# Altium footprint library DrPCB.PcbLib: 910 footprints (part 10 of 57)
Each footprint in its own frame and in the unit in brackets; x right, y up, seen from the top. Pads: shape width x height; smd on the part's side, far side on the other; paste and mask are expansions set on the pad; w line width, h text height; cw(c..) or ccw(c..) is an arc to the next point about the centre after c.
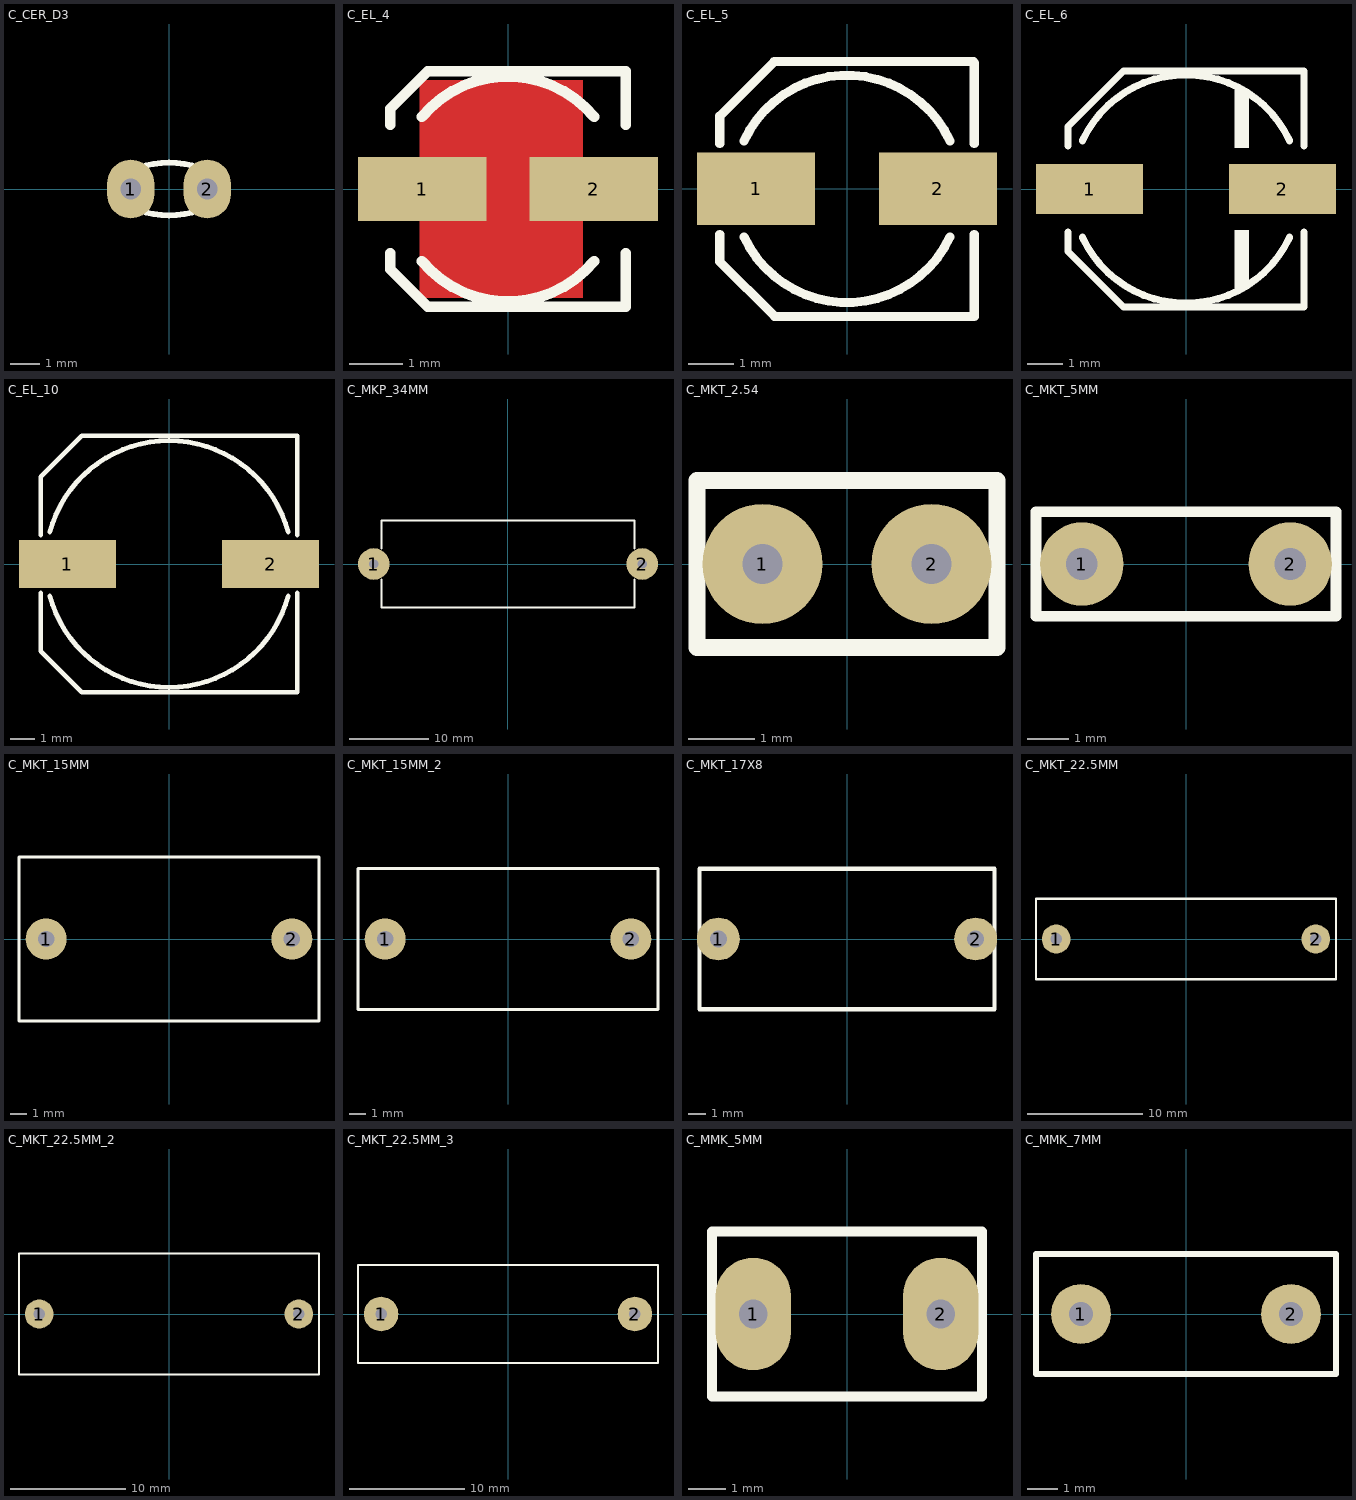
[diagram p9: the footprints below, top view; thin cyan lines are the x and y axes]

## C_CER_D3 [mm] "CAP, CER MULTILAYER, D:3.5mm, pitch: 2.54mm"
height 5.5
pads (2):
  oval 1.6x2 hole 0.7: 1(-1.3,0) 2(1.3,0)
Top Overlay:
  lines w0.2: -0.776,-0.798 ccw(c0,2.1) 0.776,-0.798 ; -0.776,0.798 cw(c0,-2.1) 0.776,0.798
3D body "User Library-Cer-Cap2 (3_5x1_5).step": height 4, standoff -2.5, extent -1.75,-0.75 1.75,0.751

## C_EL_4 [mm] "Electrolytic Cap, D: 4.3mm, Size B, 3.9mm Height"
height 3.9
pads (2):
  rect 2.4x1.2 smd: 1(-1.6,0) 2(1.6,0)
Top Layer:
  pour cut-out: 1.397,2.032 1.397,-2.032 -1.651,-2.032 -1.651,2.032
Top Overlay:
  lines w0.2: -2.2,-1.2 -2.2,-1.5 -1.5,-2.2 2.2,-2.2 2.2,-1.2 ; -2.2,1.2 -2.2,1.5 -1.5,2.2 2.2,2.2 2.2,1.2 ; -1.609,-1.35 ccw(c0,0) 1.609,-1.35 ; -1.609,1.35 cw(c0,0) 1.609,1.35
3D body "User Library-CAPSMD4x3_9.STEP": height 3.91, standoff 0, extent -2.257,-2.15 2.343,2.15

## C_EL_5 [mm] "Electrolytic Cap, D: 5.0mm, L: 5.8mm, Size C"
pads (2):
  rect 2.6x1.6 smd: 1(-2,0) 2(2,0)
Top Overlay:
  lines w0.2: -2.8,-1 -2.8,-1.6 -1.593,-2.807 2.8,-2.807 2.8,-1 ; -2.8,1 -2.8,1.6 -1.6,2.8 2.781,2.8 ; -2.266,-1.057 ccw(c0,0) 2.266,-1.057 ; -2.266,1.057 cw(c0,0) 2.266,1.057 ; 2.8,1 2.8,2.769
3D body "User Library-ALU-C.STEP": height 5.41, standoff 0, extent -2.95,-2.65 2.95,2.65

## C_EL_6 [mm] "Electrolytic Cap, D: 6.3mm L: 3.9mm, Size D"
height 4
pads (2):
  rect 3x1.4 smd: 1(-2.7,0) 2(2.7,0)
Top Overlay:
  rectangle: 1.36,-2.8 1.76,-1.143
  rectangle: 1.36,1.143 1.76,2.8
  lines w0.2: -3.3,-1.2 -3.3,-1.75 -1.75,-3.3 3.3,-3.3 3.3,-1.2 ; -3.3,1.2 -3.3,1.75 -1.75,3.3 3.3,3.3 3.3,1.2 ; -2.9,-1.352 ccw(c0,0) 2.9,-1.352 ; -2.9,1.352 cw(c0,0) 2.9,1.352
3D body "User Library-ALU-D.STEP": height 5.4, standoff 0, extent -3.5,-3.3 3.5,3.3

## C_EL_10 [mm] "Electrolytic Cap, 10.3mm, L: 10mm"
height 10
pads (2):
  rect 4x2 smd: 1(-4.2,0) 2(4.2,0)
Top Overlay:
  lines w0.2: -5.3,-1.2 -5.3,-3.6 -3.6,-5.3 5.3,-5.3 5.3,-1.2 ; -5.3,1.2 -5.3,3.6 -3.6,5.3 5.3,5.3 5.3,1.2 ; -4.926,-1.32 ccw(c0,0) 4.926,-1.32 ; -4.926,1.32 cw(c0,0) 4.926,1.32
3D body "User Library-ALU-G.STEP": height 10.2, standoff 0, extent -5.8,-5.15 5.8,5.15

## C_MKP_34MM [mm]
pads (2):
  round 4 hole 1.2: 1(-17,0) 2(17,0)
Top Overlay:
  lines w0.254: -16,-1.943 -16,-5.5 16,-5.5 16,-1.943 ; -16,1.943 -16,5.5 16,5.5 16,1.943

## C_MKT_2.54 [mm]
pads (2):
  round 1.8 hole 0.6: 1(-1.27,0) 2(1.27,0)
Top Overlay:
  lines w0.254: -2.25,1.206 -2.25,-1.25 2.25,-1.25 2.25,1.206 ; -2.25,1.25 2.25,1.25

## C_MKT_5MM [mm]
pads (2):
  round 2 hole 0.762: 1(-2.5,0) 2(2.5,0)
Top Overlay:
  lines w0.254: -3.6,-1.25 -3.6,1.25 3.6,1.25 3.6,-1.25 -3.6,-1.25
3D body "47nF Film Capacitor MKT.STEP": height 6.41, standoff -15.14, extent -3.55,-1.15 3.55,1.15

## C_MKT_15MM [mm]
pads (2):
  round 2.5 hole 1: 1(-7.5,0) 2(7.5,0)
Top Overlay:
  lines w0.2: -9.157,-5.004 -9.157,5.004 9.157,5.004 9.157,-5.004 -9.157,-5.004
3D body "r463i333050m1k.stp": height 16.11, standoff -4.99, extent -9.25,-5.101 9.25,5.101

## C_MKT_15MM_2 [mm]
pads (2):
  round 2.5 hole 1: 1(-7.5,0) 2(7.5,0)
Top Overlay:
  lines w0.2: -9.157,-4.3 -9.157,4.3 9.157,4.3 9.157,-4.3 -9.157,-4.3
3D body: height 14.8, standoff 0, extent -9.169,-4.305 9.131,4.267

## C_MKT_17X8 [mm]
pads (2):
  round 2.5 hole 1: 1(-7.5,0) 2(7.5,0)
Top Overlay:
  lines w0.254: -8.6,-4.1 -8.6,4.1 8.6,4.1 8.6,-4.1 -8.6,-4.1

## C_MKT_22.5MM [mm]
pads (2):
  round 2.5 hole 1: 1(-11.25,0) 2(11.25,0)
Top Overlay:
  lines w0.2: -13,-3.5 -13,3.5 13,3.5 13,-3.5 -13,-3.5
3D body "phe426hd7100jr06l2.stp": height 16.5, standoff -6, extent -13,-3.503 13,3.503

## C_MKT_22.5MM_2 [mm]
pads (2):
  round 2.5 hole 1: 1(-11.25,0) 2(11.25,0)
Top Overlay:
  lines w0.2: -13,-5.25 13,-5.25 13,5.25 -13,5.25 -13,-5.25
3D body: height 19, standoff 0, extent -12.992,-5.245 13.005,5.232

## C_MKT_22.5MM_3 [mm]
pads (2):
  round 3 hole 1: 1(-11,0) 2(11,0)
Top Overlay:
  lines w0.2: -13,-4.25 13,-4.25 13,4.25 -13,4.25 -13,-4.25
3D body: height 17, standoff 0, extent -13.018,-4.267 12.992,4.242

## C_MMK_5MM [mm]
pads (2):
  oval 2x3 hole 0.762: 1(-2.5,0) 2(2.5,0)
Top Overlay:
  lines w0.254: -3.6,-2.2 -3.6,2.2 3.6,2.2 3.6,-2.2 -3.6,-2.2

## C_MMK_7MM [mm]
pads (2):
  round 2 hole 0.8: 1(-3.5,0) 2(3.5,0)
Top Overlay:
  lines w0.2: -5,-2 5,-2 ; -5,-1.972 -5,2 5,2 5,-1.972
3D body: height 7, standoff 0, extent -5.004,-2.007 4.978,2.007